# Altium footprint library PCBLIB.PcbLib: 775 footprints (part 21 of 49)
Each footprint in its own frame and in the unit in brackets; x right, y up, seen from the top. Pads: shape width x height; smd on the part's side, far side on the other; paste and mask are expansions set on the pad; w line width, h text height; cw(c..) or ccw(c..) is an arc to the next point about the centre after c.
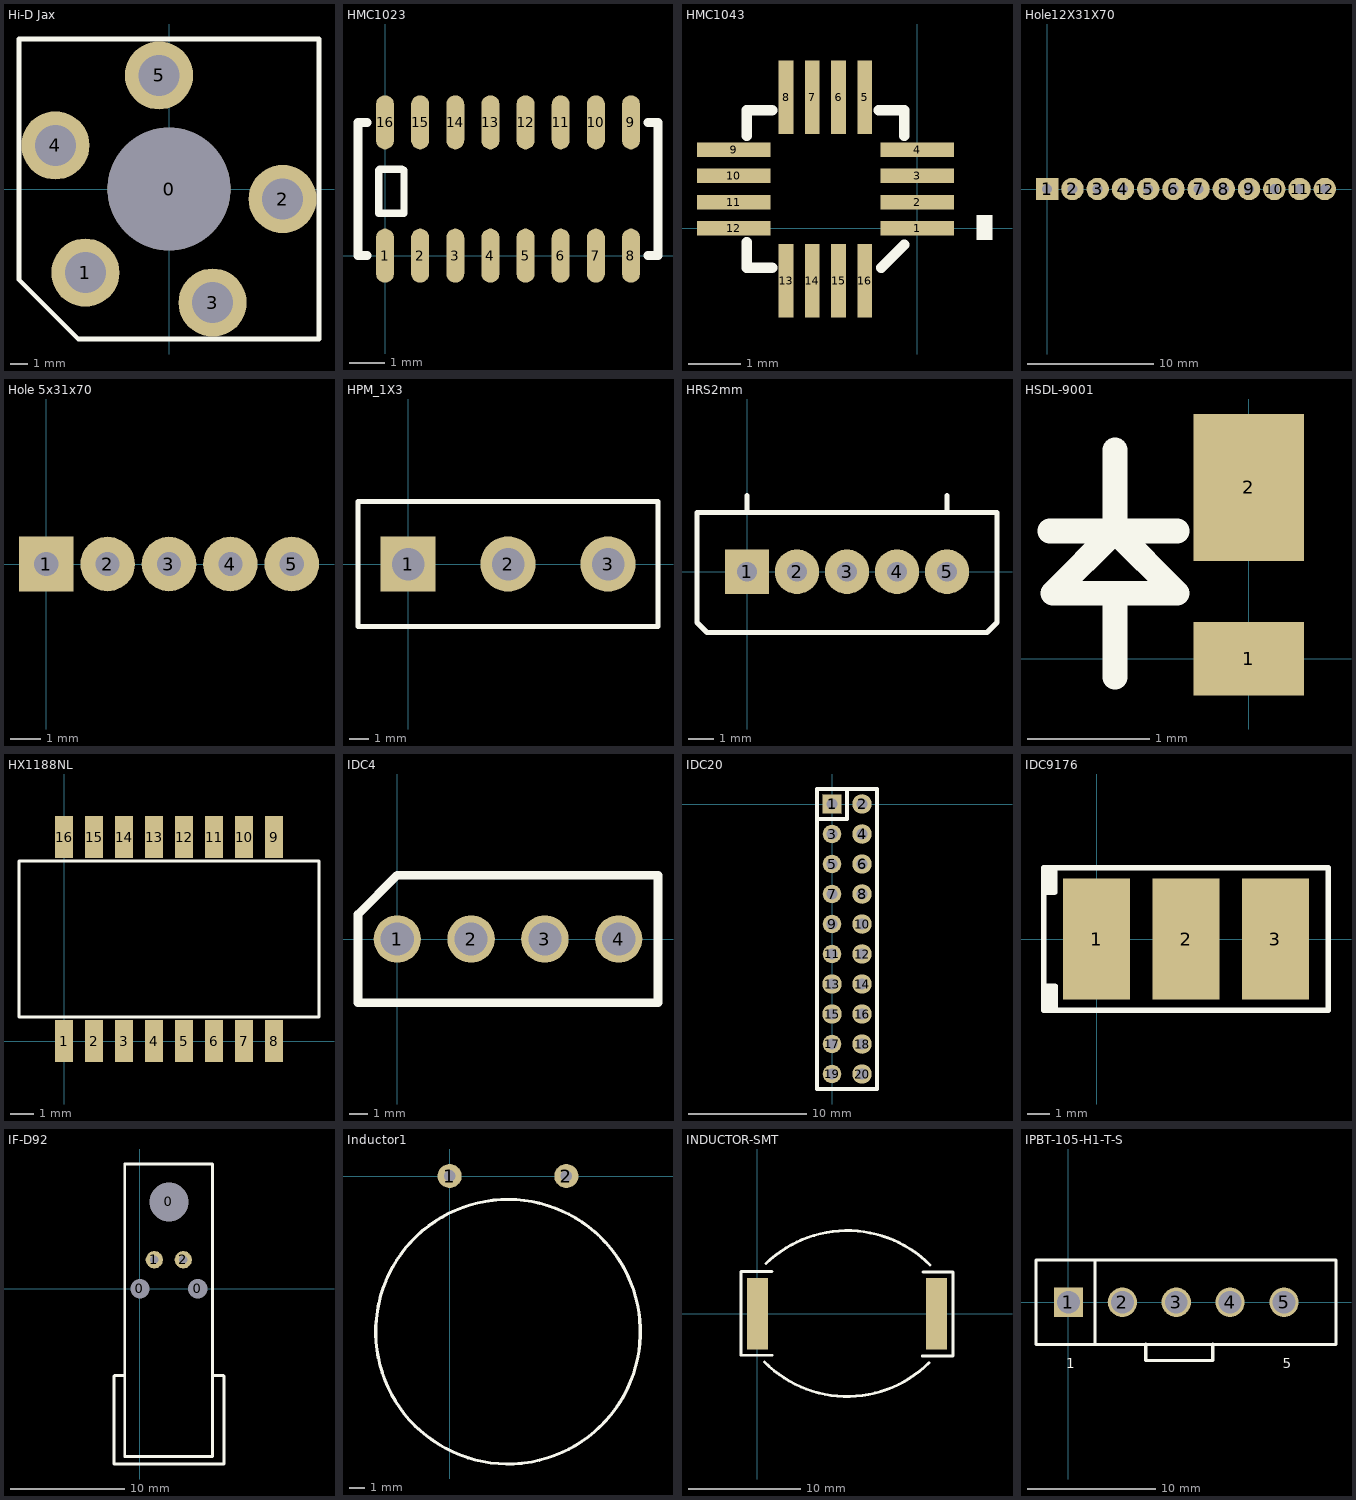
[diagram p20: the footprints below, top view; thin cyan lines are the x and y axes]

## Hi-D Jax [mil] "1/4\" enclosed telephone jack"
pads (6):
  round 270 hole 270 unplated: 0(0,0)
  round 150 hole 90: 1(-184,-184) 2(250,-22) 3(96,-250) 4(-250,96) 5(-22,250)
TopOverlay:
  lines w10: -330,-200 -330,330 330,330 330,-330 -200,-330 -330,-200

## HMC1023 [mil]
height 42
pads (16):
  oval 20x60 smd: 1(0,0) 2(39,0) 3(78,0) 4(117,0) 5(156,0) 6(195,0) 7(234,0) 8(273,0) 9(273,148) 10(234,148) 11(195,148) 12(156,148) 13(117,148) 14(78,148) 15(39,148) 16(0,148)
TopOverlay:
  lines w8: -7,47 -7,95 -6,96 19,96 ; -6,47 19,47 21,49 ; 21,47 21,95
  lines w10: -20,0 -30,0 -30,148 -20,148 ; 292,0 303,0 303,148 292,148

## HMC1043 [mm]
pads (16):
  rect 1.397x0.28 smd: 1(0,0) 2(0,0.5) 3(0,1) 4(0,1.5) 9(-3.497,1.5) 10(-3.497,1) 11(-3.497,0.5) 12(-3.497,0)
  rect 0.28x1.397 smd: 5(-0.999,2.499) 6(-1.499,2.499) 7(-1.999,2.499) 8(-2.499,2.499) 13(-2.499,-0.998) 14(-1.999,-0.998) 15(-1.499,-0.998) 16(-0.999,-0.998)
TopOverlay:
  region: 1.435,-0.222 1.435,0.254 1.127,0.254 1.127,-0.222
  lines w0.203: -3.249,-0.267 -3.249,-0.75 -2.766,-0.75 ; -3.249,1.767 -3.249,2.25 -2.766,2.25 ; -0.731,2.25 -0.249,2.25 -0.249,1.767 ; -0.686,-0.75 -0.249,-0.313

## Hole12X31X70 [mil]
pads (12):
  rect 70x70 hole 31: 1(0,1)
  round 70 hole 31: 2(78.74,1) 3(157.48,1) 4(236.22,1) 5(314.96,1) 6(393.7,1) 7(472.44,1) 8(551.18,1) 9(629.92,1) 10(708.66,1) 11(787.4,1) 12(866.14,1)

## Hole 5x31x70 [mil]
height 5
pads (5):
  rect 70x70 hole 31: 1(0,0)
  round 70 hole 31: 2(78.74,0) 3(157.48,0) 4(236.22,0) 5(314.96,0)

## HPM_1X3 [mil]
height 243
pads (3):
  rect 110x110 hole 65: 1(0,0)
  round 110 hole 65: 2(200,0) 3(400,0)
TopOverlay:
  lines w10: -100,-125 500,-125 500,125 -100,125 -100,-125
Mechanical4:
  text ".4" at 28.5,0 h1

## HRS2mm [mil]
pads (5):
  rect 70x70 hole 31: 1(0,0)
  round 70 hole 31: 2(78.74,0) 3(157.48,0) 4(236.22,0) 5(314.96,0)
TopOverlay:
  lines w8: 0,93.31 0,113 0,120 ; 315,93.31 315,120 ; -78.74,-79.92 -62.99,-95.67 377.95,-95.67 393.7,-79.92 393.7,93.31 -78.74,93.31 -78.74,-79.92

## HSDL-9001 [mm]
pads (2):
  rect 0.9x0.6 smd: 1(0,0)
  rect 0.9x1.2 smd: 2(0,1.4)
TopOverlay:
  lines w0.203: -1.626,1.044 -0.584,1.044 ; -1.092,-0.149 -1.092,0.536 ; -1.092,1.705 -1.092,1.349 -1.092,1.044 ; -1.092,1.044 -1.6,0.536 -0.584,0.536 -1.092,1.044

## HX1188NL [mil]
height 236
pads (16):
  rect 30x70 smd: 1(0,0) 2(50,0) 3(100,0) 4(150,0) 5(200,0) 6(250,0) 7(300,0) 8(350,0) 9(350,340) 10(300,340) 11(250,340) 12(200,340) 13(150,340) 14(100,340) 15(50,340) 16(0,340)
TopOverlay:
  lines w5: -75,40 -75,300 425,300 425,40 -75,40
  text "." at -11.89,-76.11 h200

## IDC4 [mil]
pads (4):
  round 100 hole 70 unplated: 1(0,0) 2(156,0) 3(312,0) 4(468,0)
TopOverlay:
  lines w18: -83,-135 551,-135 551,135 0,135 -83,52 -83,45 -83,-135

## IDC20 [mil]
pads (20):
  rect 65x65 hole 38: 1(0,0)
  round 65 hole 38: 2(100,0) 4(100,-100) 6(100,-200) 8(100,-300) 10(100,-400) 12(100,-500) 13(0,-600) 14(100,-600) 15(0,-700) 16(100,-700) 18(100,-800) 20(100,-900)
  round 62 hole 38: 3(0,-100) 5(0,-200) 7(0,-300) 9(0,-400) 11(0,-500) 17(0,-800) 19(0,-900)
TopOverlay:
  lines w12: -50,-50 50,-50 50,50 ; -50,-950 -50,50 150,50 150,-950 -50,-950

## IDC9176 [mil] "Wire to Board Strip IDC Connector"
height 5.1
pads (3):
  rect 118x213 smd: 1(0,0) 2(157,0) 3(314,0)
TopOverlay:
  lines w10: -92,82 -74,82 -74,125 ; -91,-83 -73,-83 -73,-125 ; -84,84 -84,120 ; -83,-83 -83,-119 ; -73,-106 -81,-98 -83,-98 -80,-95 -80,-92 -73,-99 -73,-109 -83,-119 ; -93,-125 -93,125 407,125 407,-125 -93,-125 ; -93,-125 -87,-119 -83,-119

## IF-D92 [mil] "Photo transistor"
pads (5):
  round 60 hole 66 unplated: 0(0,0) 0(200,0)
  round 60 hole 135 unplated: 0(99.97,299.9)
  round 60 hole 30: 1(50,100) 2(150,100)
TopOverlay:
  lines w10: -53.94,-300.13 -87.67,-300.13 -88.87,-301.33 -88.87,-604.99 290.14,-604.99 290.14,-300.97 288.45,-299.29 250.72,-299.29 ; -52.25,430.31 -52.25,-579.69 244.6,-579.69 250.41,-579.69 ; -48.91,430.62 250.72,430.62 250.72,-579.38

## Inductor1 [mil]
pads (2):
  round 62 hole 30: 1(0,0) 2(300,0)
TopOverlay:
  lines w8: 185.54,-738.14 cw(c150,-400) 191.44,-737.47
Mechanical4:
  text ".290" at 0,0 h1

## INDUCTOR-SMT [mm]
height 10
pads (2):
  rect 1.9x6.35 smd: ""(0,0) ""(15.9,0)
TopOverlay:
  lines w0.254: 0.638,-4.289 ccw(c7.965,2.982) 15.237,-4.345 ; 0.757,4.464 cw(c7.976,-2.972) 15.332,4.329 ; 1.295,-3.683 -1.448,-3.683 -1.448,3.759 1.295,3.759 ; 14.63,-3.734 17.374,-3.734 17.374,3.708 14.707,3.708

## IPBT-105-H1-T-S [mil]
pads (5):
  rect 90x90 hole 70: 1(0,0)
  round 90 hole 70: 2(165,0) 3(330,0) 4(494.65,0.02) 5(660,0)
TopOverlay:
  lines w9.84: 80.9,-127.88 80.9,129.5 ; 236.71,-128.79 236.71,-178.79 441.71,-178.79 441.71,-128.79 ; -99.5,-129.5 819.14,-129.5 819.14,129.5 -99.5,129.5 -99.5,-129.5
  text "1" at -6.75,-201.51 h30
  text "5" at 655.46,-201.51 h30